# Altium footprint library IND_SMD.PcbLib: 69 footprints (part 1 of 5)
Each footprint in its own frame and in the unit in brackets; x right, y up, seen from the top. Pads: shape width x height; smd on the part's side, far side on the other; paste and mask are expansions set on the pad; w line width, h text height; cw(c..) or ccw(c..) is an arc to the next point about the centre after c.
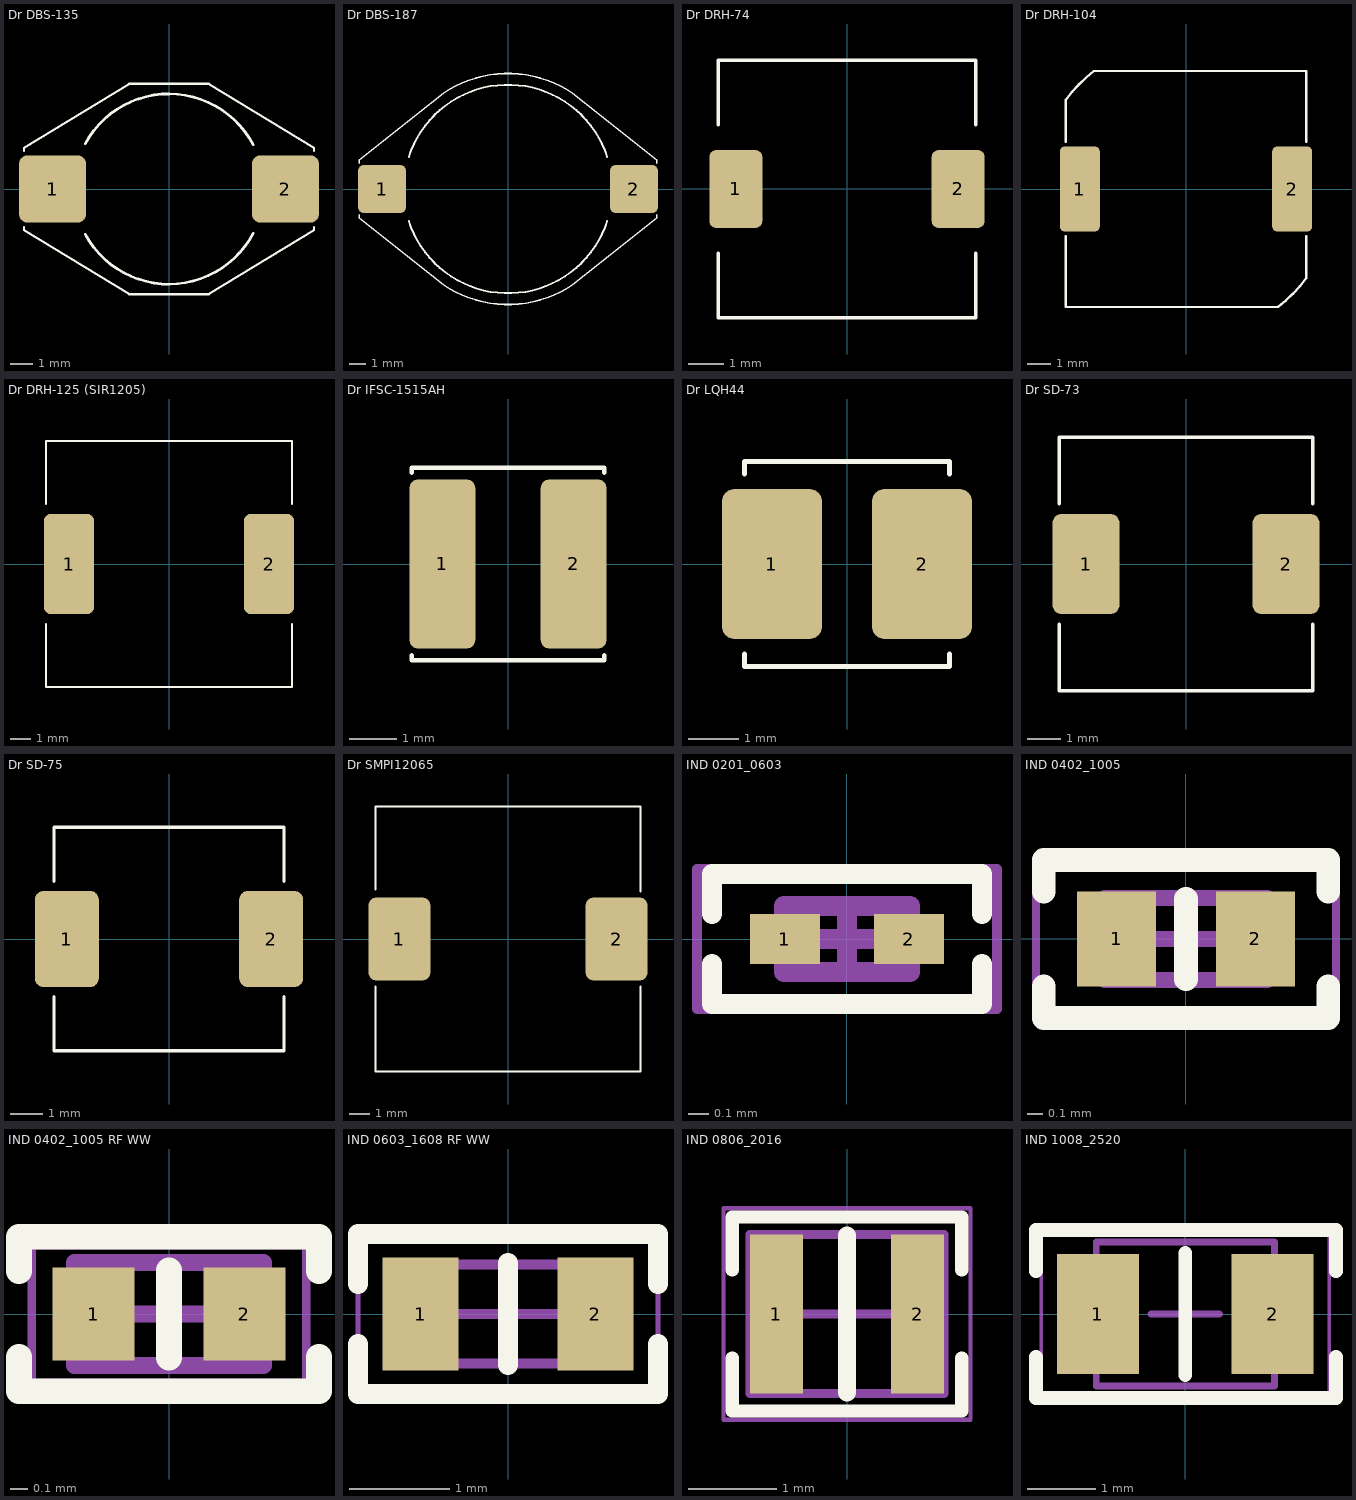
[diagram p0: the footprints below, top view; thin cyan lines are the x and y axes]

## Dr DBS-135 [mm]
pads (2):
  rrect25% 3x3 smd: 1(-5.2,0) 2(5.2,0)
Top Overlay:
  lines w0.1: -6.48,-1.7 -6.48,-1.829 -1.778,-4.7 1.773,-4.7 ; -6.48,1.7 -6.48,1.829 -1.777,4.7 1.773,4.7 ; 1.777,4.7 6.479,1.83 ; 1.777,-4.7 6.48,-1.829 6.48,-1.7 ; 6.479,1.7 6.479,1.829
  lines w0.125: -3.741,-2.018 ccw(c0,0) 3.761,-1.979 ; -3.741,2.018 cw(c0,0) 3.761,1.979
3D body "DO3316P 13x9.4x5.2.STEP": height 5.21, standoff 0, extent -6.48,-4.7 6.48,4.7

## Dr DBS-187 [mm]
pads (2):
  rrect25% 3x3 smd: 1(-7.85,0) 2(7.85,0)
Top Overlay:
  lines w0.1: -9.27,-1.6 -9.27,-1.808 -4.027,-5.968 ; -9.27,1.614 -9.27,1.823 ; -9.27,1.808 -4.027,5.968 ; -4.027,-5.969 ccw(c0,0) 4.027,-5.969 ; -4.027,5.969 cw(c0,0) 4.027,5.969 ; 4.027,-5.968 9.27,-1.808 9.27,-1.6 ; 4.027,5.968 9.27,1.808 ; 9.27,1.614 9.27,1.823
  lines w0.125: -6.186,-1.996 ccw(c0,0) 6.186,-1.996 ; -6.186,1.995 cw(c0,0) 6.186,1.995
3D body "Dr DBS-187.STEP": height 4.85, standoff 0.1, extent -9.27,-7.2 9.27,7.3

## Dr DRH-74 [mm]
pads (2):
  rrect25% 1.5x2.2 smd: 1(-3.15,0) 2(3.15,0)
Top Overlay:
  lines w0.1: -3.65,-1.825 -3.65,-3.65 3.65,-3.65 3.65,-1.825 ; -3.65,1.825 -3.65,3.65 3.65,3.65 3.65,1.825
3D body "DR-74.STEP": height 4.35, standoff 0, extent -3.65,-3.65 3.65,3.65

## Dr DRH-104 [mm]
pads (2):
  rrect25% 1.7x3.6 smd: 1(-4.5,0) 2(4.5,0)
Top Overlay:
  lines w0.1: -5.1,-2 -5.1,-5 3.9,-5 ; -5.1,2 -5.1,3.794 ; -5.092,3.787 cw(c0,-0.007) -3.905,5 5.1,5 5.1,2 ; 3.902,-5.003 ccw(c0,0.007) 5.093,-3.786 ; 5.1,-3.786 5.1,-2
3D body "MSS1038 10x10x3.8.STEP": height 3.8, standoff -0.01, extent -5.105,-5 5.105,5

## Dr DRH-125 (SIR1205) [mm]
pads (2):
  rrect25% 2.5x5 smd: 1(-5,0) 2(5,0)
Top Overlay:
  lines w0.1: -6.15,-3 -6.15,-6.15 6.15,-6.15 6.15,-3 ; -6.15,3 -6.15,6.15 6.15,6.15 6.15,3
3D body "MSS1260 12x12x6.STEP": height 6.2, standoff 0.06, extent -6.15,-6.15 6.15,6.15

## Dr IFSC-1515AH [mm]
pads (2):
  rrect25% 1.4x3.6 smd: 1(-1.397,0) 2(1.397,0)
Top Overlay:
  lines w0.1: -2.05,-1.95 -2.05,-2.05 2.05,-2.05 2.05,-1.95 ; -2.05,1.95 -2.05,2.05 2.05,2.05 2.05,1.95
3D body "IFSC-1515AH.STEP": height 1.8, standoff 0, extent -1.975,-1.975 1.975,1.975

## Dr LQH44 [mm] "4x4x1.65mm"
height 1.65
pads (2):
  rrect25% 2x3 smd: 1(-1.5,0) 2(1.5,0)
Top Overlay:
  lines w0.1: -2.05,-1.8 -2.05,-2.05 2.05,-2.05 2.05,-1.8 ; -2.05,1.8 -2.05,2.05 2.05,2.05 2.05,1.8
3D body "LQH44PN P0.STEP": height 1.65, standoff 0, extent -2,-1.997 2,1.998

## Dr SD-73 [mm] "7x7x3.2mm"
height 3.2
pads (2):
  rrect25% 2x3 smd: 1(-3,0) 2(3,0)
Top Overlay:
  lines w0.1: -3.8,-1.8 -3.8,-3.8 3.8,-3.8 3.8,-1.8 ; -3.8,1.8 -3.8,3.8 3.8,3.8 3.8,1.8
3D body "DR73-74.STEP": height 3.55, standoff 0, extent -3.8,-3.8 3.8,3.8

## Dr SD-75 [mm] "7.3x7.3x5mm"
height 5
pads (2):
  rrect25% 2x3 smd: 1(-3.2,0) 2(3.2,0)
Top Overlay:
  lines w0.1: -3.6,-1.8 -3.6,-3.5 3.6,-3.5 3.6,-1.8 ; -3.6,1.8 -3.6,3.5 3.6,3.5 3.6,1.8
3D body "Dr SMD SLF7045T.STEP": height 4.61, standoff 0, extent -3.6,-3.5 3.6,3.5

## Dr SMPI12065 [mm]
pads (2):
  rrect25% 3x4 smd: 1(-5.25,0) 2(5.25,0)
Top Overlay:
  lines w0.1: -6.4,-2.3 -6.4,-6.4 6.4,-6.4 6.4,-2.3 ; -6.4,2.4 -6.4,6.4 6.4,6.4 6.4,2.3
3D body "AX02-30.STEP": height 5.99, standoff 0, extent -7.487,-6.639 7.487,6.655

## IND 0201_0603 [mm] "Inductor, 2-Leads, Body 0.60x0.30mm, IPC Medium Density"
height 0.33
pads (2):
  rect 0.35x0.25 smd: 1(-0.31,0) 2(0.31,0)
Top Overlay:
  lines w0.1: -0.675,-0.125 -0.675,-0.325 0.675,-0.325 0.675,-0.125 ; -0.675,0.125 -0.675,0.325 0.675,0.325 0.675,0.125
Mechanical 13:
  lines w0.1: -0.315,-0.165 -0.315,0.165 0.315,0.165 0.315,-0.165 -0.315,-0.165
Mechanical 15:
  lines w0.05: -0.75,-0.35 -0.75,0.35 0.75,0.35 0.75,-0.35 -0.75,-0.35
  lines w0.1: -0.165,0 0.165,0 ; 0,-0.165 0,0.165
3D body "INDUC 0201.step": height 0.3, standoff 0, extent -0.3,-0.15 0.3,0.15

## IND 0402_1005 [mm] "Inductor, 2-Leads, Body 1.02x0.51mm, IPC Medium Density"
height 0.6
pads (2):
  rect 0.5x0.6 smd: 1(-0.44,0) 2(0.44,0)
Top Overlay:
  lines w0.15: -0.9,-0.3 -0.9,-0.5 0.9,-0.5 0.9,-0.3 ; -0.9,0.3 -0.9,0.5 0.9,0.5 0.9,0.3 ; 0,-0.254 0,0.254
Mechanical 13:
  lines w0.1: -0.515,-0.26 0.515,-0.26 0.515,0.26 -0.515,0.26 -0.515,-0.26
Mechanical 15:
  lines w0.05: -0.95,-0.5 0.95,-0.5 0.95,0.5 -0.95,0.5 -0.95,-0.5
  lines w0.1: -0.26,0 0.26,0 ; 0,-0.26 0,0.26
3D body "INDUC 0402.step": height 0.6, standoff 0, extent -0.5,-0.3 0.5,0.3

## IND 0402_1005 RF WW [mm] "Chip Inductor, 2-Leads, Body 1.00x0.50mm, IPC High Density"
height 0.6
pads (2):
  rect 0.48x0.54 smd: 1(-0.44,0) 2(0.44,0)
Top Overlay:
  lines w0.15: -0.875,-0.25 -0.875,-0.45 0.875,-0.45 0.875,-0.25 ; -0.875,0.25 -0.875,0.45 0.875,0.45 0.875,0.25 ; 0,-0.254 0,0.254
Mechanical 13:
  lines w0.1: -0.55,-0.3 0.55,-0.3 0.55,0.3 -0.55,0.3 -0.55,-0.3
Mechanical 15:
  lines w0.05: -0.8,-0.4 0.8,-0.4 0.8,0.4 -0.8,0.4 -0.8,-0.4
  lines w0.1: -0.3,0 0.3,0 ; 0,-0.3 0,0.3
3D body "IND-WireWound_TOP.STEP": height 0.51, standoff 0.26, extent -0.5,-0.287 0.5,0.287
3D body "IND-WireWound.STEP": height 0.5, standoff 0, extent -0.5,-0.276 0.5,0.277

## IND 0603_1608 RF WW [mm] "Chip Inductor, 2-Leads, Body 1.65x0.99mm, IPC Medium Density"
height 1
pads (2):
  rect 0.76x1.13 smd: 1(-0.875,0) 2(0.875,0)
Top Overlay:
  lines w0.2: -1.5,-0.3 -1.5,-0.8 1.5,-0.8 1.5,-0.3 ; -1.5,0.3 -1.5,0.8 1.5,0.8 1.5,0.3 ; 0,-0.508 0,0.508
Mechanical 13:
  lines w0.1: -0.825,-0.495 -0.825,0.495 0.825,0.495 0.825,-0.495 -0.825,-0.495
Mechanical 15:
  lines w0.05: -1.5,-0.85 -1.5,0.85 1.5,0.85 1.5,-0.85 -1.5,-0.85
  lines w0.1: -0.495,0 0.495,0 ; 0,-0.495 0,0.495
3D body "INDUC - 0603_1608 v4.step": height 0.79, standoff 0, extent -0.835,-0.536 0.835,0.55
3D body "INDUC - 0603_1608 v4.1.step": height 1, standoff 0.67, extent -0.835,-0.58 0.835,0.58

## IND 0806_2016 [mm] "Chip Capacitor, 2-Leads, Body 2.00x1.20mm, IPC Medium Density"
height 1.8
pads (2):
  rect 0.6x1.8 smd: 1(-0.8,0) 2(0.8,0)
Top Overlay:
  lines w0.15: -1.3,-0.5 -1.3,-1.1 1.3,-1.1 1.3,-0.5 ; -1.3,0.5 -1.3,1.1 1.3,1.1 1.3,0.5
  lines w0.2: 0,-0.889 0,0.889
Mechanical 13:
  lines w0.1: -1.1,-0.9 1.1,-0.9 1.1,0.9 -1.1,0.9 -1.1,-0.9
Mechanical 15:
  lines w0.05: -1.4,-1.2 1.4,-1.2 1.4,1.2 -1.4,1.2 -1.4,-1.2
  lines w0.1: -0.5,0 0.5,0 ; 0,-0.5 0,0.5
3D body "INDUC 0806.step": height 1.81, standoff -0.01, extent -1.01,-0.91 1.01,0.91

## IND 1008_2520 [mm] "Chip Inductance, 2-leads, Body 2.5x2.1mm, IPC Medium Density"
height 0.9
pads (2):
  rect 1.2x1.75 smd: 1(-1.275,0) 2(1.275,0)
Top Overlay:
  lines w0.2: -2.178,-0.625 -2.178,-1.225 2.2,-1.225 2.2,-0.625 ; -2.178,0.625 -2.178,1.225 2.2,1.225 2.2,0.625 ; 0,-0.889 0,0.889
Mechanical 13:
  lines w0.1: -1.3,-1.05 1.3,-1.05 1.3,1.05 -1.3,1.05 -1.3,-1.05
Mechanical 15:
  lines w0.05: -2.1,-1.2 -2.1,1.2 2.1,1.2 2.1,-1.2 -2.1,-1.2
  lines w0.1: -0.5,0 0.5,0 ; 0,-0.5 0,0.5
3D body "INDUC 1008.step": height 1, standoff 0, extent -1.3,-1.05 1.3,1.05